# Altium footprint library PCBLIB.PcbLib: 103 footprints (part 3 of 7)
Each footprint in its own frame and in the unit in brackets; x right, y up, seen from the top. Pads: shape width x height; smd on the part's side, far side on the other; paste and mask are expansions set on the pad; w line width, h text height; cw(c..) or ccw(c..) is an arc to the next point about the centre after c.
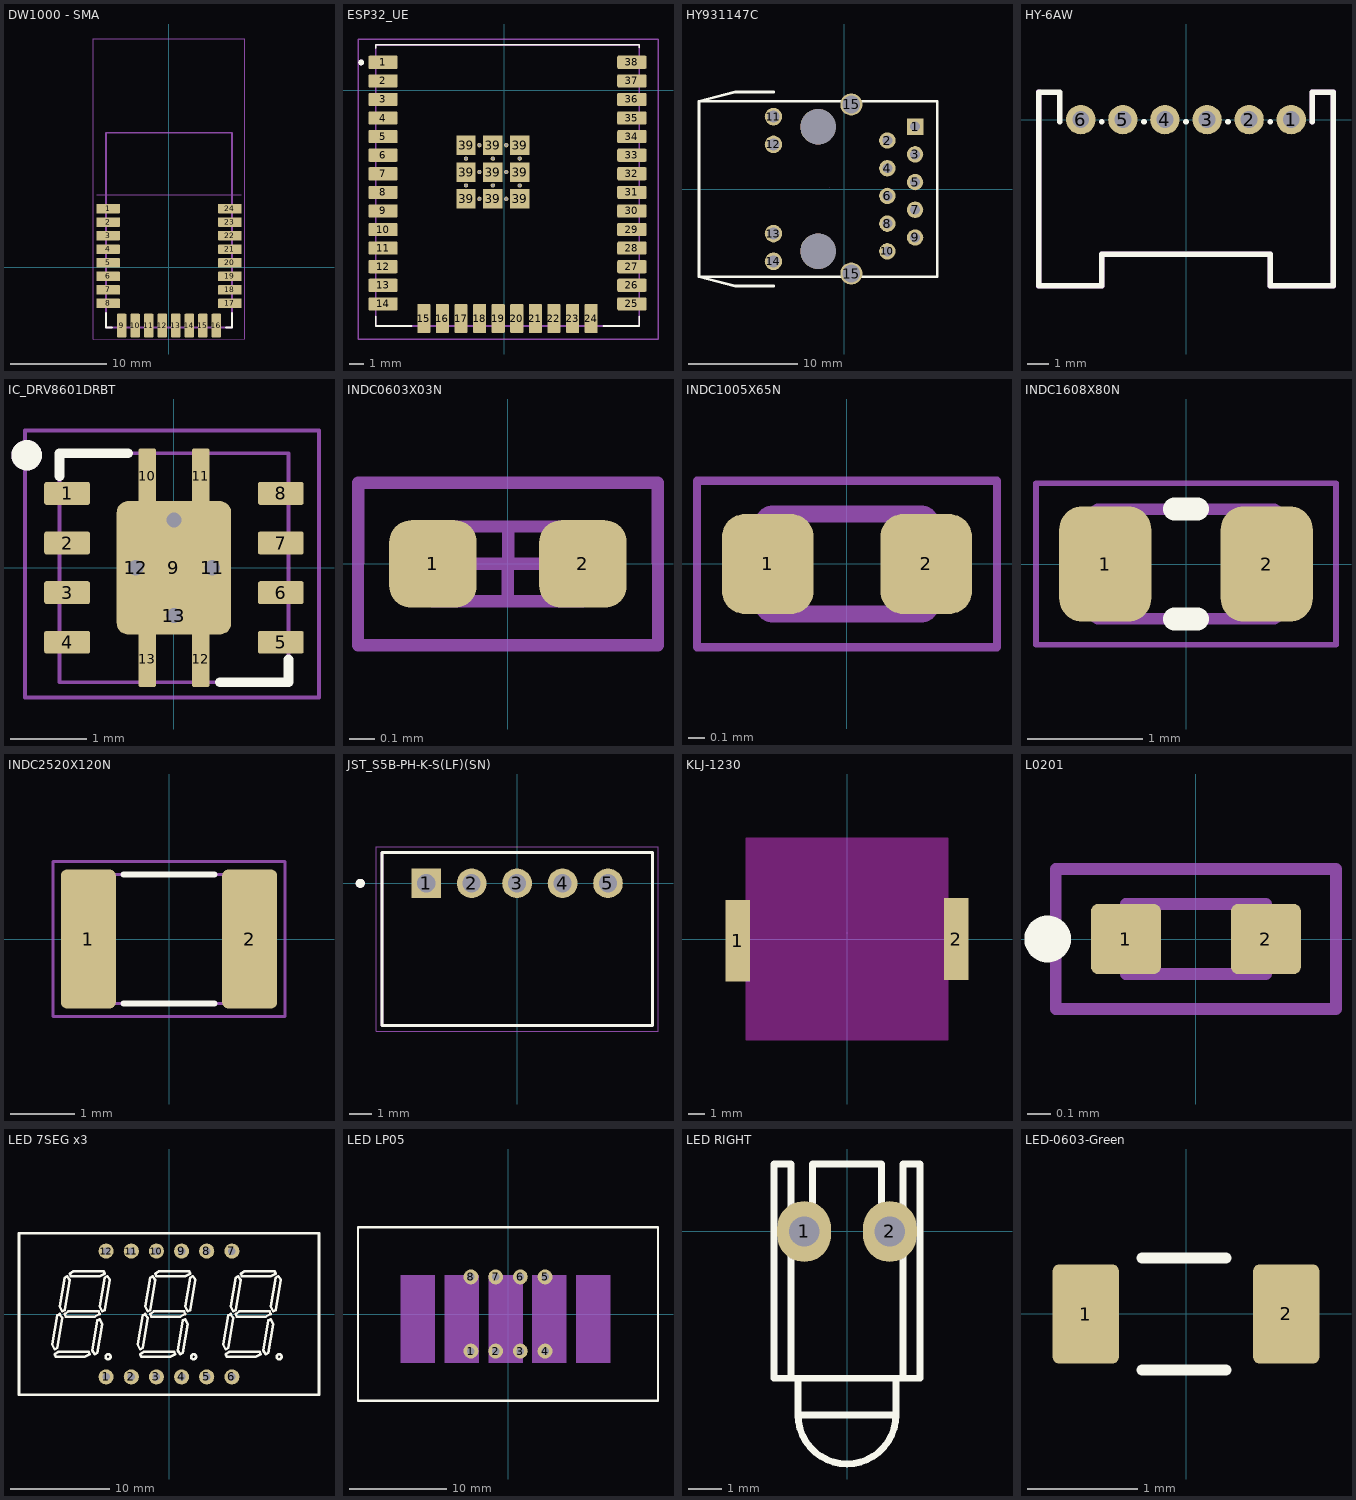
[diagram p2: the footprints below, top view; thin cyan lines are the x and y axes]

## DW1000 - SMA [mm]
height 9
pads (24):
  rrect20% 2.45x1 smd paste+0 mask+0.05: 1(-6.295,6.048) 2(-6.295,4.648) 3(-6.295,3.248) 4(-6.295,1.848) 5(-6.295,0.448) 6(-6.295,-0.952) 7(-6.295,-2.352) 8(-6.295,-3.752) 17(6.295,-3.752) 18(6.295,-2.352) 19(6.295,-0.952) 20(6.295,0.448) 21(6.295,1.848) 22(6.295,3.248) 23(6.295,4.648) 24(6.295,6.048)
  rrect20% 1x2.45 smd paste+0 mask+0.05: 9(-4.9,-6.047) 10(-3.5,-6.047) 11(-2.1,-6.047) 12(-0.7,-6.047) 13(0.7,-6.047) 14(2.1,-6.047) 15(3.5,-6.047) 16(4.9,-6.047)
Top Overlay:
  lines w0.2: -6.5,-4.752 -6.5,-6.252 -5.9,-6.252 ; 5.9,-6.252 6.5,-6.252 6.5,-4.753
Top Component Outline:
  lines w0.1: -7.825,-7.437 7.825,-7.437 7.825,23.6 -7.825,23.6 -7.825,-7.437
Top Assembly:
  lines w0.1: -7.5,7.5 7.5,7.5
  lines w0.2: -6.5,-6.252 6.5,-6.252 6.5,13.9 -6.5,13.9 -6.5,-6.252
3D body "Assem1.x_t": height 4.92, standoff -1.43, extent -6.6,-6.3 6.6,23.525

## ESP32_UE [mm]
pads (59):
  rrect20% 2x0.9 smd mask+0.05: 1(-8.285,1.91) 2(-8.285,0.64) 3(-8.285,-0.63) 4(-8.285,-1.9) 5(-8.285,-3.17) 6(-8.285,-4.44) 7(-8.285,-5.71) 8(-8.285,-6.98) 9(-8.285,-8.25) 10(-8.285,-9.52) 11(-8.285,-10.79) 12(-8.285,-12.06) 13(-8.285,-13.33) 14(-8.285,-14.6) 25(8.715,-14.6) 26(8.715,-13.33) 27(8.715,-12.06) 28(8.715,-10.79) 29(8.715,-9.52) 30(8.715,-8.25) 31(8.715,-6.98) 32(8.715,-5.71) 33(8.715,-4.44) 34(8.715,-3.17) 35(8.715,-1.9) 36(8.715,-0.63) 37(8.715,0.64) 38(8.715,1.91)
  rrect20% 0.9x2 smd mask+0.05: 15(-5.5,-15.6) 16(-4.23,-15.6) 17(-2.96,-15.6) 18(-1.69,-15.6) 19(-0.42,-15.6) 20(0.85,-15.6) 21(2.12,-15.6) 22(3.39,-15.6) 23(4.66,-15.6) 24(5.93,-15.6)
  rect 1.33x1.33 smd: 39(-2.62,-5.59) 39(-2.62,-3.755) 39(-2.62,-7.425) 39(-0.785,-5.59) 39(-0.785,-3.755) 39(-0.785,-7.425) 39(1.05,-7.425) 39(1.05,-5.59) 39(1.05,-3.755)
  round 0.3 hole 0.2: 39_10(-1.702,-3.755) 39_11(0.133,-3.755) 39_12(-2.62,-4.673) 39_13(-0.785,-4.673) 39_14(1.05,-4.672) 39_15(-1.702,-5.59) 39_16(0.133,-5.59) 39_17(-2.62,-6.507) 39_18(-0.785,-6.508) 39_19(1.05,-6.507) 39_20(-1.702,-7.425) 39_21(0.133,-7.425)
Top Overlay:
  circle w0.2: c-9.785,1.9 r0.1
  lines w0.127: -8.785,-15.45 -8.785,-16.1 -6.335,-16.1 ; -8.785,2.895 -8.785,3.11 9.215,3.11 9.215,2.9 ; 6.765,-16.1 9.215,-16.1 9.215,-15.45
Top Component Outline:
  lines w0.1: -10,-17 10.5,-17 10.5,3.5 -10,3.5 -10,-17
Bottom Courtyard:
  circle w0.2: c-9.785,1.9 r0.1
  lines w0.127: -8.785,3.1 9.215,3.1 ; -8.785,3.1 -8.785,-16.1 9.215,-16.1 9.215,3.1 ; -8.785,3.1 9.215,3.1
3D body "ESP32-WROOM-32UE--3DModel-STEP-269445.STEP": height 3.35, standoff 0, extent -8.785,-16.1 9.215,3.1

## HY931147C [mm]
pads (18):
  rect 1.5x1.5 hole 0.9: 1(6.49,5.715)
  round 1.5 hole 0.9: 2(3.95,4.445) 3(6.49,3.175) 4(3.95,1.905) 5(6.49,0.635) 6(3.95,-0.635) 7(6.49,-1.905) 8(3.95,-3.175) 9(6.49,-4.445) 10(3.95,-5.715)
  round 1.6 hole 1.1: 11(-6.49,6.629) 12(-6.49,4.089) 13(-6.49,-4.089) 14(-6.49,-6.629)
  round 2.029 hole 1.631: 15(0.648,-7.747) 15(0.648,7.747)
  round 3.25 hole 3.25 unplated: ""(-2.4,-5.7) ""(-2.4,5.7)
Top Overlay:
  lines w0.254: -6.464,-8.89 -10.02,-8.89 -13.322,-8.052 ; -6.464,8.89 -10.02,8.89 -13.322,8.052 ; -1.13,-8.052 -13.322,-8.052 ; -1.13,8.052 -13.322,8.052 ; 2.172,-8.052 8.522,-8.052 ; 2.172,8.052 8.522,8.052 ; -13.322,-8.052 -13.322,8.052 ; -13.322,-8.052 8.522,-8.052 ; -13.322,-8.052 -13.322,8.052 ; -13.322,8.052 8.522,8.052 ; 8.522,-8.052 8.522,8.052 ; 8.522,-8.052 8.522,8.052
Bottom 3D Body:
  lines w0.003: -1.321,0.127 -1.321,0.127
Multi-Layer:
  pour cut-out: -13.5,-10.5 -13.5,10.5 14,10.5 14,-10.5
3D body "User Library-HY931147C.STEP": height 2.45, standoff -15.85, extent -13.15,-9.175 7.9,9.175

## HY-6AW [mm]
pads (6):
  round 1.4 hole 0.8: 1(5,0) 2(3,0) 3(1,0) 4(-1,0) 5(-3,0) 6(-5,0)
Top Overlay:
  lines w0.254: -4.012,-0.1 -3.988,-0.1 ; -2.012,-0.1 -1.988,-0.1 ; -0.012,-0.1 0.012,-0.1 ; 1.988,-0.1 2.012,-0.1 ; 3.988,-0.1 4.012,-0.1 ; 5.988,-0.1 6,-0.1 6,1.3 7,1.3 7,-7.9 4,-7.9 4,-6.4 -4,-6.4 -4,-7.9 -7,-7.9 -7,1.3 ; -7,1.3 -6,1.3 ; -7,1.3 -6,1.3 ; -6,-0.1 -5.988,-0.1 -6,-0.1 ; -6,-0.1 -6,1.3 ; -6,-0.1 -6,1.3
Bottom 3D Body:
  region: 7.127,-7.9 7.127,-7.925 7.108,-7.972 7.072,-8.008 7.025,-8.027 7,-8.027 4,-8.027 3.975,-8.027 3.928,-8.008 3.892,-7.972 3.873,-7.925 3.873,-7.9 3.873,-6.527 -3.873,-6.527 -3.873,-7.9 -3.873,-7.925 -3.892,-7.972 -3.928,-8.008 -3.975,-8.027 -4,-8.027 -7,-8.027 -7.025,-8.027 -7.072,-8.008 -7.108,-7.972 -7.127,-7.925 -7.127,-7.9 -7.127,1.3 -7.127,1.325 -7.108,1.372 -7.072,1.408 -7.025,1.427 -7,1.427 -6.975,1.427 -6.928,1.408 -6.892,1.372 -6.873,1.325 -6.873,1.3 -6.873,-7.773 -4.127,-7.773 -4.127,-6.4 -4.127,-6.375 -4.108,-6.328 -4.072,-6.292 -4.025,-6.273 -4,-6.273 4,-6.273 4.025,-6.273 4.072,-6.292 4.108,-6.328 4.127,-6.375 4.127,-6.4 4.127,-7.773 6.873,-7.773 6.873,1.173 6.127,1.173 6.127,-0.1 6.127,-0.125 6.108,-0.172 6.072,-0.208 6.025,-0.227 6,-0.227 5.988,-0.227 5.963,-0.227 5.916,-0.208 5.88,-0.172 5.861,-0.125 5.861,-0.1 5.861,-0.093 5.863,-0.079 5.866,-0.066 5.87,-0.053 5.873,-0.046 5.873,1.3 5.873,1.325 5.892,1.372 5.928,1.408 5.975,1.427 6,1.427 7,1.427 7.025,1.427 7.072,1.408 7.108,1.372 7.127,1.325 7.127,1.3
3D body "JST-S6B-PH-K-S.STEP": height 4.8, standoff -3.4, extent -6.95,-6.3 6.95,1.3

## IC_DRV8601DRBT [mm]
pads (16):
  rrect20% 0.6x0.3 smd mask+0.05: 1(-1.4,0.975) 2(-1.4,0.325) 3(-1.4,-0.325) 4(-1.4,-0.975) 5(1.4,-0.975) 6(1.4,-0.325) 7(1.4,0.325) 8(1.4,0.975)
  rrect20% 1.5x1.75 smd paste-2 mask+0.05: 9(0,0)
  rrect20% 0.23x0.725 smd mask+0.05: 10(-0.35,1.2) 11(0.35,1.2) 12(0.35,-1.2) 13(-0.35,-1.2)
  round 0.4 hole 0.2 mask+0.05: 11(0.5,0) 12(-0.5,0) 13(0,-0.625)
via 0.5,0 diameter 0.4 hole 0.2
via 0,-0.625 diameter 0.4 hole 0.2
via -0.5,0 diameter 0.4 hole 0.2
via 0,0.625 diameter 0.4 hole 0.2
Top Overlay:
  circle w0.2: c-1.93,1.475 r0.1
  lines w0.127: -1.5,1.2 -1.5,1.5 -0.6,1.5 ; 0.6,-1.5 1.5,-1.5 1.5,-1.2
Top Component Center:
  lines w0.05: -0.15,0 0.15,0 ; 0,-0.15 0,0.15
Top Component Outline:
  lines w0.05: -1.95,-1.7 1.9,-1.7 1.9,1.8 -1.95,1.8 -1.95,-1.7
Top Assembly:
  circle w0.2: c-1.93,1.475 r0.1
  lines w0.05: -1.5,-1.5 -1.5,1.5 1.5,1.5 1.5,-1.5 -1.5,-1.5
  text ".Designator" at 0.897,-0.09 h0.4
3D body "TPS7A3001DRBR.STEP": height 1, standoff 0, extent -1.5,-1.5 1.5,1.5

## INDC0603X03N [mm] "Chip Inductor, 2-Leads, Body 0.60x0.30mm, IPC Medium Density"
height 0.3
pads (2):
  rrect50% 0.35x0.35 smd mask+0.05: 1(-0.3,0) 2(0.3,0)
Top Component Center:
  lines w0.05: -0.15,0 0.15,0 ; 0,-0.15 0,0.15
Top Component Outline:
  lines w0.05: -0.6,-0.325 0.6,-0.325 0.6,0.325 -0.6,0.325 -0.6,-0.325
Top Assembly:
  lines w0.05: -0.3,-0.15 -0.3,0.15 0.3,0.15 0.3,-0.15 -0.3,-0.15
  text ".Designator" at -0.53,-0.1 h0.4
3D body "INDC0603X03N.step": height 0.3, standoff 0, extent -0.3,-0.15 0.3,0.15

## INDC1005X65N [mm] "Chip FIXED IND 1mm x 0.05mm"
height 0.65
pads (2):
  rrect50% 0.55x0.6 smd mask+0.05: 1(-0.475,0) 2(0.475,0)
Top Component Outline:
  lines w0.05: -0.9,-0.5 0.9,-0.5 0.9,0.5 -0.9,0.5 -0.9,-0.5
Top Assembly:
  region: 0.3,-0.3 0.45,-0.3 0.46,-0.3 0.478,-0.292 0.492,-0.278 0.5,-0.26 0.5,-0.25 0.5,0.25 0.5,0.26 0.492,0.278 0.478,0.292 0.46,0.3 0.45,0.3 0.3,0.3
  region: -0.45,-0.3 -0.46,-0.3 -0.478,-0.292 -0.492,-0.278 -0.5,-0.26 -0.5,-0.25 -0.5,0.25 -0.5,0.26 -0.492,0.278 -0.478,0.292 -0.46,0.3 -0.45,0.3 -0.3,0.3 -0.3,-0.3
  lines w0.1: -0.3,-0.3 0.3,-0.3 ; -0.3,-0.3 -0.45,-0.3 cw(c-0.45,-0.25) -0.5,-0.25 -0.5,0.25 cw(c-0.45,0.25) -0.45,0.3 -0.3,0.3 ; -0.3,-0.3 -0.3,0.3 ; -0.3,0.3 0.3,0.3 ; 0.3,-0.3 0.45,-0.3 ccw(c0.45,-0.25) 0.5,-0.25 0.5,0.25 ccw(c0.45,0.25) 0.45,0.3 0.3,0.3 ; 0.3,-0.3 0.3,0.3
Top Designator:
  text ".Designator" at 1.583,0.158 h0.7
Bottom Designator:
  text ".Comment" at -0.446,-0.124 h0.64
Mechanical 11:
  text ".Designator" at -0.446,-0.124 h0.64
3D body "INDC1005X60N EIA 0402.step": height 0.51, standoff 0.01, extent -0.5,-0.3 0.5,0.3

## INDC1608X80N [mm]
pads (2):
  rrect50% 0.8x1 smd mask+0.05: 1(-0.7,0) 2(0.7,0)
Top Overlay:
  lines w0.2: -0.1,-0.475 0.1,-0.475 ; -0.1,0.475 0.1,0.475
Top Component Outline:
  lines w0.05: -1.3,-0.7 1.3,-0.7 1.3,0.7 -1.3,0.7 -1.3,-0.7
Top Assembly:
  region: 0.5,-0.475 0.5,0.475 0.75,0.475 0.76,0.475 0.778,0.467 0.792,0.453 0.8,0.435 0.8,0.425 0.8,-0.425 0.8,-0.435 0.792,-0.453 0.778,-0.467 0.76,-0.475 0.75,-0.475
  region: -0.8,-0.425 -0.8,-0.435 -0.792,-0.453 -0.778,-0.467 -0.76,-0.475 -0.75,-0.475 -0.5,-0.475 -0.5,0.475 -0.75,0.475 -0.76,0.475 -0.778,0.467 -0.792,0.453 -0.8,0.435 -0.8,0.425
  lines w0.1: -0.5,-0.475 -0.5,0.475 ; -0.5,-0.475 -0.75,-0.475 cw(c-0.75,-0.425) -0.8,-0.425 -0.8,0.425 cw(c-0.75,0.425) -0.75,0.475 -0.5,0.475 ; -0.5,-0.475 0.5,-0.475 ; -0.5,0.475 0.5,0.475 ; 0.5,-0.475 0.5,0.475 ; 0.5,-0.475 0.75,-0.475 ccw(c0.75,-0.425) 0.8,-0.425 0.8,0.425 ccw(c0.75,0.425) 0.75,0.475 0.5,0.475
Top Designator:
  text ".Designator" at -1.578,-0.158 h0.7
Bottom Designator:
  text ".Comment" at -0.519,-0.108 h0.64
Mechanical 11:
  text ".Designator" at -0.519,-0.108 h0.64
3D body "INDC1608X95N EIA 0603.step": height 0.81, standoff 0.01, extent -0.8,-0.475 0.8,0.475

## INDC2520X120N [mm]
pads (2):
  rrect20% 0.85x2.15 smd mask+0.05: 1(-1.25,0) 2(1.25,0)
Top Overlay:
  lines w0.1: -0.7,-1 0.7,-1 ; -0.7,1 0.7,1
Top Component Outline:
  lines w0.05: -1.8,-1.2 -1.8,1.2 1.8,1.2 1.8,-1.2 -1.8,-1.2
Top Designator:
  text ".Designator" at -0.897,-0.09 h0.4
Bottom Designator:
  text ".Designator" at -0.8,-0.1 h0.5
Mechanical 10:
  lines w0.05: -1.3,-1 -1.3,1 1.2,1 1.2,-1 -1.3,-1
3D body: height 1.2, standoff 0, extent -1.25,-1 -0.65,1
3D body: height 1.2, standoff 0, extent 0.65,-1 1.25,1
3D body: height 1.2, standoff 0, extent -0.65,-1 0.65,1

## JST_S5B-PH-K-S(LF)(SN) [mm]
height 4.8
pads (5):
  rect 1.308x1.308 / inner round 1.308 / far side rect 1.308x1.308 hole 0.8: 1(-4,0)
  round 1.308 hole 0.8: 2(-2,0) 3(0,0) 4(2,0) 5(4,0)
Top Overlay:
  circle w0.2: c-6.9,0 r0.1
  lines w0.127: -5.95,-6.25 5.95,-6.25 5.95,1.35 -5.95,1.35 -5.95,-6.25
Bottom Courtyard:
  circle w0.2: c-6.9,0 r0.1
  lines w0.127: -5.95,-6.25 -5.95,1.35 5.95,1.35 5.95,-6.25 -5.95,-6.25
Bottom 3D Body:
  lines w0.05: -6.2,-6.5 -6.2,1.6 6.2,1.6 6.2,-6.5 -6.2,-6.5
3D body "step_temp.STEP": height 4.8, standoff -3.38, extent -5.95,-6.25 5.95,1.35

## KLJ-1230 [mm]
pads (2):
  rect 1.5x5 all layers, no hole: 1(-6.7,-0.1) 2(6.7,0)
Keep-Out Layer:
  board cut-out: -6.2,6.2 6.2,6.2 6.2,-6.2 -6.2,-6.2
Bottom 3D Body:
  lines w0.003: 0,0.397 0,0.397
3D body: height 3.3, standoff 0, extent -6,-6 6,6

## L0201 [mm]
pads (2):
  rrect20% 0.3x0.3 smd mask+0.05: 1(-0.3,0) 2(0.3,0)
Top Overlay:
  circle w0.1: c-0.635,0 r0.05
Top Component Outline:
  lines w0.05: -0.6,-0.3 -0.6,0.3 0.6,0.3 0.6,-0.3 -0.6,-0.3
Top Assembly:
  lines w0.05: -0.3,-0.15 0.3,-0.15 0.3,0.15 -0.3,0.15 -0.3,-0.15
3D body "LQP03HQ6N2H02B.stp": height 0.42, standoff 0, extent -0.3,-0.15 0.3,0.15

## LED 7SEG x3 [mil] "Red 3 Common cathode 0.4 Plugin Led Segment Display ROHS"
pads (12):
  round 60 hole 30: 1(-250,-250) 2(-150,-250) 3(-50,-250) 4(50,-250) 5(150,-250) 6(250,-250) 7(250,250) 8(150,250) 9(50,250) 10(-50,250) 11(-150,250) 12(-250,250)
Top Overlay:
  lines w10: -242.1,-160.2 ccw(c-242,-170.04) -241.9,-160.2 ; 97.9,-160.2 ccw(c98,-170.04) 98.1,-160.2 ; 437.9,-160.2 ccw(c438,-170.04) 438.1,-160.2 ; -596.46,-320.87 596.46,-320.87 596.46,-250 596.46,250 596.46,320.87 -596.46,320.87 -596.46,250 -596.46,-250 -596.46,-320.87 ; -465,-120 -445,-5 -435,0 -425,-15 -445,-135 -455,-140 -465,-120 ; -455,-160 -450,-170 -335,-170 -315,-160 -320,-150 -440,-150 -455,-160 ; -435,30 -415,145 -405,150 -395,135 -415,15 -425,10 -435,30 ; -415,0 -410,-10 -295,-10 -275,0 -280,10 -400,10 -415,0 ; -395,160 -390,150 -275,150 -255,160 -260,170 -380,170 -395,160 ; -305,-145 -285,-25 -275,-20 -265,-40 -285,-155 -295,-160 -305,-145 ; -275,30 -255,145 -245,150 -235,135 -255,15 -265,10 -275,30 ; -125,-120 -105,-5 -95,0 -85,-15 -105,-135 -115,-140 -125,-120 ; -115,-160 -110,-170 5,-170 25,-160 20,-150 -100,-150 -115,-160 ; -95,30 -75,145 -65,150 -55,135 -75,15 -85,10 -95,30 ; -75,0 -70,-10 45,-10 65,0 60,10 -60,10 -75,0 ; -55,160 -50,150 65,150 85,160 80,170 -40,170 -55,160 ; 35,-145 55,-25 65,-20 75,-40 55,-155 45,-160 35,-145 ; 65,30 85,145 95,150 105,135 85,15 75,10 65,30 ; 215,-120 235,-5 245,0 255,-15 235,-135 225,-140 215,-120 ; 225,-160 230,-170 345,-170 365,-160 360,-150 240,-150 225,-160 ; 245,30 265,145 275,150 285,135 265,15 255,10 245,30 ; 265,0 270,-10 385,-10 405,0 400,10 280,10 265,0 ; 285,160 290,150 405,150 425,160 420,170 300,170 285,160 ; 375,-145 395,-25 405,-20 415,-40 395,-155 385,-160 375,-145 ; 405,30 425,145 435,150 445,135 425,15 415,10 405,30
Bottom 3D Body:
  lines w0.1: -0.01,13.31 0.01,13.33
3D body: height 275.59, standoff 0, extent -596.46,-320.87 596.46,320.87
3D body: height 277.56, standoff 275.59, extent -455,-170 -315,-150
3D body: height 277.56, standoff 275.59, extent -465,-140 -425,0
3D body: height 277.56, standoff 275.59, extent -305,-160 -265,-20
3D body: height 277.56, standoff 275.59, extent -415,-10 -275,10
3D body: height 277.56, standoff 275.59, extent -435,10 -395,150
3D body: height 277.56, standoff 275.59, extent -275,10 -235,150
3D body: height 277.56, standoff 275.59, extent -395,150 -255,170
3D body: height 277.56, standoff 275.59, extent -115,-170 25,-150
3D body: height 277.56, standoff 275.59, extent -125,-140 -85,0
3D body: height 277.56, standoff 275.59, extent 35,-160 75,-20
3D body: height 277.56, standoff 275.59, extent -75,-10 65,10
3D body: height 277.56, standoff 275.59, extent -95,10 -55,150
3D body: height 277.56, standoff 275.59, extent 65,10 105,150
3D body: height 277.56, standoff 275.59, extent -55,150 85,170
3D body: height 277.56, standoff 275.59, extent 225,-170 365,-150
3D body: height 277.56, standoff 275.59, extent 215,-140 255,0
3D body: height 277.56, standoff 275.59, extent 375,-160 415,-20
3D body: height 277.56, standoff 275.59, extent 265,-10 405,10
3D body: height 277.56, standoff 275.59, extent 245,10 285,150
3D body: height 277.56, standoff 275.59, extent 405,10 445,150
3D body: height 277.56, standoff 275.59, extent 285,150 425,170
3D body: height 277.56, standoff 0, extent -253.81,-181.85 -230.19,-158.23
3D body: height 277.56, standoff 0, extent 86.19,-181.85 109.81,-158.23
3D body: height 277.56, standoff 0, extent 426.19,-181.85 449.81,-158.23

## LED LP05 [mil]
pads (8):
  round 60 hole 30: 1(-150,-150) 2(-50,-150) 3(50,-150) 4(150,-150) 5(150,150) 6(50,150) 7(-50,150) 8(-150,150)
Top Overlay:
  lines w10: -606.3,-350.39 -606.3,350.39 606.3,350.39 606.3,-350.39 -606.3,-350.39
Top 3D Body:
  region: -255.91,157.48 -118.11,157.48 -118.11,-196.85 -255.91,-196.85
  region: -78.74,157.48 59.06,157.48 59.06,-196.85 -78.74,-196.85
  region: 98.43,157.48 236.22,157.48 236.22,-196.85 98.43,-196.85
  region: 275.59,157.48 413.39,157.48 413.39,-196.85 275.59,-196.85
  region: -433.07,157.48 -295.28,157.48 -295.28,-196.85 -433.07,-196.85
3D body: height 236.22, standoff 0, extent -606.3,-350.39 606.3,350.39
3D body: height 236.42, standoff 236.22, extent -531.5,-275.59 570.87,255.91
3D body: height 236.42, standoff 236.22, extent -433.07,-196.85 -295.28,157.48
3D body: height 236.42, standoff 236.22, extent -255.91,-196.85 -118.11,157.48
3D body: height 236.42, standoff 236.22, extent -78.74,-196.85 59.06,157.48
3D body: height 236.42, standoff 236.22, extent 98.43,-196.85 236.22,157.48
3D body: height 236.42, standoff 236.22, extent 275.59,-196.85 413.39,157.48

## LED RIGHT [mm]
pads (2):
  oval 1.6x1.8 hole 0.9: 1(-1.27,0) 2(1.27,0)
Top Overlay:
  lines w0.2: -1.52,-0.2 -1.02,-0.2 ; -1.52,0.3 -1.02,0.3 ; -1.45,-4.35 -1.45,-5.44 ccw(c0,-5.44) 0,-6.89 ccw(c0,-5.44) 1.45,-5.44 1.45,-4.35 ; -1.45,-5.44 1.45,-5.44 ; -1.45,-4.35 1.45,-4.35 ; 1.52,-0.2 1.02,-0.2 ; 1.52,0.3 1.02,0.3 ; -2.16,-4.35 -2.16,2 -1.66,2 -1.66,-4.35 ; -2.16,-4.35 2.16,-4.35 ; -2.16,-4.35 -1.66,-4.35 ; -1.66,-4.35 1.66,-4.35 ; -1.02,-0.2 -1.02,0.3 ; -1.02,-0.2 -1.02,0.3 ; -1.02,-0.2 -1.02,2 ; -1.02,0.3 -1.02,2 ; -1.02,2 1.02,2 ; 1.02,-0.2 1.02,0.3 ; 1.02,-0.2 1.02,0.3 ; 1.02,-0.2 1.02,2 ; 1.02,0.3 1.02,2 ; 1.66,-4.35 2.16,-4.35 ; 1.66,-4.35 1.66,2 2.16,2 2.16,-4.35
3D body "934EW-1.x_t": height 7.45, standoff -3.53, extent -2.16,-6.89 2.16,2

## LED-0603-Green [mm]
height 9
pads (2):
  rrect20% 0.6x0.9 smd mask+0.05: 1(-0.908,0) 2(0.908,0)
Top Overlay:
  lines w0.1: -0.4,-0.508 0.362,-0.508 ; -0.4,0.508 0.362,0.508
3D body "User Library-led_0805-Green.step": height 1.1, standoff 0, extent -1.003,-0.625 1.017,0.625